# Altium footprint library Connector_Samtec_HLE_SMD.PcbLib: 290 footprints (part 17 of 24) (continued)
## Samtec_HLE-141-02-xxx-DV-A_2x41_P2.54mm_Horizontal [mm] (continued)
F.CrtYd:
  lines w0.05: -52.57,-4.17 52.57,-4.17 52.57,4.17 -52.57,4.17 -52.57,-4.17
F.Fab:
  lines w0.1: -51.3,2.54 -50.8,1.833 -50.3,2.54 ; -52.07,-2.54 52.07,-2.54 52.07,2.54 -52.07,2.54 -52.07,-2.54
  text "'.Designator'" at -4.047,-2.68 h1

## Samtec_HLE-141-02-xxx-DV-BE-A_2x41_P2.54mm_Horizontal [mm]
pads (166):
  rect 1.27x1.68 smd: 1(-50.8,2.72) 2(-50.8,-2.72) 3(-48.26,2.72) 4(-48.26,-2.72) 5(-45.72,2.72) 6(-45.72,-2.72) 7(-43.18,2.72) 8(-43.18,-2.72) 9(-40.64,2.72) 10(-40.64,-2.72) 11(-38.1,2.72) 12(-38.1,-2.72) 13(-35.56,2.72) 14(-35.56,-2.72) 15(-33.02,2.72) 16(-33.02,-2.72) 17(-30.48,2.72) 18(-30.48,-2.72) 19(-27.94,2.72) 20(-27.94,-2.72) 21(-25.4,2.72) 22(-25.4,-2.72) 23(-22.86,2.72) 24(-22.86,-2.72) 25(-20.32,2.72) 26(-20.32,-2.72) 27(-17.78,2.72) 28(-17.78,-2.72) 29(-15.24,2.72) 30(-15.24,-2.72) 31(-12.7,2.72) 32(-12.7,-2.72) 33(-10.16,2.72) 34(-10.16,-2.72) 35(-7.62,2.72) 36(-7.62,-2.72) 37(-5.08,2.72) 38(-5.08,-2.72) 39(-2.54,2.72) 40(-2.54,-2.72) 41(0,2.72) 42(0,-2.72) 43(2.54,2.72) 44(2.54,-2.72) 45(5.08,2.72) 46(5.08,-2.72) 47(7.62,2.72) 48(7.62,-2.72) 49(10.16,2.72) 50(10.16,-2.72) 51(12.7,2.72) 52(12.7,-2.72) 53(15.24,2.72) 54(15.24,-2.72) 55(17.78,2.72) 56(17.78,-2.72) 57(20.32,2.72) 58(20.32,-2.72) 59(22.86,2.72) 60(22.86,-2.72) 61(25.4,2.72) 62(25.4,-2.72) 63(27.94,2.72) 64(27.94,-2.72) 65(30.48,2.72) 66(30.48,-2.72) 67(33.02,2.72) 68(33.02,-2.72) 69(35.56,2.72) 70(35.56,-2.72) 71(38.1,2.72) 72(38.1,-2.72) 73(40.64,2.72) 74(40.64,-2.72) 75(43.18,2.72) 76(43.18,-2.72) 77(45.72,2.72) 78(45.72,-2.72) 79(48.26,2.72) 80(48.26,-2.72) 81(50.8,2.72) 82(50.8,-2.72)
  round 0.97 hole 0.97: Un1(38.1,1.27) Un2(-30.48,1.27) Un3(10.16,-1.27) Un4(-43.18,-1.27) Un5(-17.78,1.27) Un6(20.32,1.27) Un7(45.72,-1.27) Un8(2.54,1.27) Un9(-27.94,1.27) Un10(-40.64,-1.27) Un11(-2.54,1.27) Un12(-38.1,1.27) Un13(17.78,-1.27) Un14(17.78,1.27) Un15(22.86,1.27) Un16(40.64,-1.27) Un17(45.72,1.27) Un18(27.94,-1.27) Un19(0,1.27) Un21(-25.4,1.27) Un22(48.26,1.27) Un23(-12.7,-1.27) Un24(-33.02,-1.27) Un25(35.56,1.27) Un26(15.24,1.27) Un27(2.54,-1.27) Un28(7.62,1.27) Un29(-48.26,-1.27) Un30(-7.62,1.27) Un31(-7.62,-1.27) Un32(-20.32,-1.27) Un33(-43.18,1.27) Un34(-17.78,-1.27) Un35(-38.1,-1.27) Un36(30.48,1.27) Un37(33.02,1.27) Un38(-40.64,1.27) Un39(5.08,1.27) Un40(12.7,-1.27) Un41(35.56,-1.27) Un42(-10.16,1.27) Un43(25.4,1.27) Un44(22.86,-1.27) Un45(27.94,1.27) Un46(-48.26,1.27) Un47(-45.72,1.27) Un48(15.24,-1.27) Un49(-35.56,-1.27) Un50(-33.02,1.27) Un51(-25.4,-1.27) Un52(7.62,-1.27) Un53(0,-1.27) Un54(40.64,1.27) Un55(43.18,1.27) Un56(-50.8,1.27) Un57(-15.24,-1.27) Un58(-35.56,1.27) Un59(38.1,-1.27) Un60(20.32,-1.27) Un61(-20.32,1.27) Un62(-27.94,-1.27) Un63(43.18,-1.27) Un64(-12.7,1.27) Un65(-15.24,1.27) Un66(25.4,-1.27) Un67(5.08,-1.27) Un68(50.8,1.27) Un69(10.16,1.27) Un70(-10.16,-1.27) Un71(12.7,1.27) Un72(48.26,-1.27) Un73(-50.8,-1.27) Un74(50.8,-1.27) Un75(-5.08,-1.27) Un76(30.48,-1.27) Un77(-5.08,1.27) Un78(-45.72,-1.27) Un79(-22.86,1.27) Un80(-2.54,-1.27) Un82(33.02,-1.27) Un83(-22.86,-1.27) Un84(-30.48,-1.27)
  round 1.78 hole 1.78: Un20(49.53,0) Un81(-49.53,0)
F.SilkS:
  lines w0.12: -51.695,-2.65 -52.18,-2.65 -52.18,2.65 -51.695,2.65 -51.695,3.56 ; -49.905,-2.65 -49.155,-2.65 ; -49.905,2.65 -49.155,2.65 ; -47.365,-2.65 -46.615,-2.65 ; -47.365,2.65 -46.615,2.65 ; -44.825,-2.65 -44.075,-2.65 ; -44.825,2.65 -44.075,2.65 ; -42.285,-2.65 -41.535,-2.65 ; -42.285,2.65 -41.535,2.65 ; -39.745,-2.65 -38.995,-2.65 ; -39.745,2.65 -38.995,2.65 ; -37.205,-2.65 -36.455,-2.65 ; -37.205,2.65 -36.455,2.65 ; -34.665,-2.65 -33.915,-2.65 ; -34.665,2.65 -33.915,2.65 ; -32.125,-2.65 -31.375,-2.65 ; -32.125,2.65 -31.375,2.65 ; -29.585,-2.65 -28.835,-2.65 ; -29.585,2.65 -28.835,2.65 ; -27.045,-2.65 -26.295,-2.65 ; -27.045,2.65 -26.295,2.65 ; -24.505,-2.65 -23.755,-2.65 ; -24.505,2.65 -23.755,2.65 ; -21.965,-2.65 -21.215,-2.65 ; -21.965,2.65 -21.215,2.65 ; -19.425,-2.65 -18.675,-2.65 ; -19.425,2.65 -18.675,2.65 ; -16.885,-2.65 -16.135,-2.65 ; -16.885,2.65 -16.135,2.65 ; -14.345,-2.65 -13.595,-2.65 ; -14.345,2.65 -13.595,2.65 ; -11.805,-2.65 -11.055,-2.65 ; -11.805,2.65 -11.055,2.65 ; -9.265,-2.65 -8.515,-2.65 ; -9.265,2.65 -8.515,2.65 ; -6.725,-2.65 -5.975,-2.65 ; -6.725,2.65 -5.975,2.65 ; -4.185,-2.65 -3.435,-2.65 ; -4.185,2.65 -3.435,2.65 ; -1.645,-2.65 -0.895,-2.65 ; -1.645,2.65 -0.895,2.65 ; 0.895,-2.65 1.645,-2.65 ; 0.895,2.65 1.645,2.65 ; 3.435,-2.65 4.185,-2.65 ; 3.435,2.65 4.185,2.65 ; 5.975,-2.65 6.725,-2.65 ; 5.975,2.65 6.725,2.65 ; 8.515,-2.65 9.265,-2.65 ; 8.515,2.65 9.265,2.65 ; 11.055,-2.65 11.805,-2.65 ; 11.055,2.65 11.805,2.65 ; 13.595,-2.65 14.345,-2.65 ; 13.595,2.65 14.345,2.65 ; 16.135,-2.65 16.885,-2.65 ; 16.135,2.65 16.885,2.65 ; 18.675,-2.65 19.425,-2.65 ; 18.675,2.65 19.425,2.65 ; 21.215,-2.65 21.965,-2.65 ; 21.215,2.65 21.965,2.65 ; 23.755,-2.65 24.505,-2.65 ; 23.755,2.65 24.505,2.65 ; 26.295,-2.65 27.045,-2.65 ; 26.295,2.65 27.045,2.65 ; 28.835,-2.65 29.585,-2.65 ; 28.835,2.65 29.585,2.65 ; 31.375,-2.65 32.125,-2.65 ; 31.375,2.65 32.125,2.65 ; 33.915,-2.65 34.665,-2.65 ; 33.915,2.65 34.665,2.65 ; 36.455,-2.65 37.205,-2.65 ; 36.455,2.65 37.205,2.65 ; 38.995,-2.65 39.745,-2.65 ; 38.995,2.65 39.745,2.65 ; 41.535,-2.65 42.285,-2.65 ; 41.535,2.65 42.285,2.65 ; 44.075,-2.65 44.825,-2.65 ; 44.075,2.65 44.825,2.65 ; 46.615,-2.65 47.365,-2.65 ; 46.615,2.65 47.365,2.65 ; 49.155,-2.65 49.905,-2.65 ; 49.155,2.65 49.905,2.65 ; 51.695,-2.65 52.18,-2.65 52.18,2.65 51.695,2.65
F.CrtYd:
  lines w0.05: -52.57,-4.06 -52.57,4.06 52.57,4.06 52.57,-4.06 -52.57,-4.06
F.Fab:
  lines w0.1: -51.3,2.54 -50.8,1.833 -50.3,2.54 ; -52.07,-2.54 52.07,-2.54 52.07,2.54 -52.07,2.54 -52.07,-2.54
  text "'.Designator'" at -4.047,-2.68 h1

## Samtec_HLE-141-02-xxx-DV-BE-LC_2x41_P2.54mm_Horizontal [mm]
pads (166):
  rect 1.27x1.68 smd: 1(-50.8,2.72) 2(-50.8,-2.72) 3(-48.26,2.72) 4(-48.26,-2.72) 5(-45.72,2.72) 6(-45.72,-2.72) 7(-43.18,2.72) 8(-43.18,-2.72) 9(-40.64,2.72) 10(-40.64,-2.72) 11(-38.1,2.72) 12(-38.1,-2.72) 13(-35.56,2.72) 14(-35.56,-2.72) 15(-33.02,2.72) 16(-33.02,-2.72) 17(-30.48,2.72) 18(-30.48,-2.72) 19(-27.94,2.72) 20(-27.94,-2.72) 21(-25.4,2.72) 22(-25.4,-2.72) 23(-22.86,2.72) 24(-22.86,-2.72) 25(-20.32,2.72) 26(-20.32,-2.72) 27(-17.78,2.72) 28(-17.78,-2.72) 29(-15.24,2.72) 30(-15.24,-2.72) 31(-12.7,2.72) 32(-12.7,-2.72) 33(-10.16,2.72) 34(-10.16,-2.72) 35(-7.62,2.72) 36(-7.62,-2.72) 37(-5.08,2.72) 38(-5.08,-2.72) 39(-2.54,2.72) 40(-2.54,-2.72) 41(0,2.72) 42(0,-2.72) 43(2.54,2.72) 44(2.54,-2.72) 45(5.08,2.72) 46(5.08,-2.72) 47(7.62,2.72) 48(7.62,-2.72) 49(10.16,2.72) 50(10.16,-2.72) 51(12.7,2.72) 52(12.7,-2.72) 53(15.24,2.72) 54(15.24,-2.72) 55(17.78,2.72) 56(17.78,-2.72) 57(20.32,2.72) 58(20.32,-2.72) 59(22.86,2.72) 60(22.86,-2.72) 61(25.4,2.72) 62(25.4,-2.72) 63(27.94,2.72) 64(27.94,-2.72) 65(30.48,2.72) 66(30.48,-2.72) 67(33.02,2.72) 68(33.02,-2.72) 69(35.56,2.72) 70(35.56,-2.72) 71(38.1,2.72) 72(38.1,-2.72) 73(40.64,2.72) 74(40.64,-2.72) 75(43.18,2.72) 76(43.18,-2.72) 77(45.72,2.72) 78(45.72,-2.72) 79(48.26,2.72) 80(48.26,-2.72) 81(50.8,2.72) 82(50.8,-2.72)
  round 0.97 hole 0.97: Un1(20.32,1.27) Un2(-43.18,-1.27) Un3(45.72,1.27) Un4(33.02,1.27) Un5(-20.32,-1.27) Un6(45.72,-1.27) Un7(-38.1,-1.27) Un8(33.02,-1.27) Un9(25.4,-1.27) Un10(20.32,-1.27) Un11(-17.78,-1.27) Un12(-48.26,-1.27) Un13(-2.54,1.27) Un14(27.94,-1.27) Un15(-27.94,1.27) Un16(5.08,1.27) Un17(-27.94,-1.27) Un18(-12.7,1.27) Un19(38.1,-1.27) Un20(-10.16,-1.27) Un21(30.48,-1.27) Un22(-22.86,1.27) Un23(38.1,1.27) Un24(-15.24,-1.27) Un25(0,1.27) Un26(-7.62,1.27) Un27(-38.1,1.27) Un28(-30.48,1.27) Un29(-35.56,-1.27) Un30(25.4,1.27) Un31(-10.16,1.27) Un32(-20.32,1.27) Un33(-33.02,-1.27) Un34(-5.08,-1.27) Un35(-5.08,1.27) Un36(12.7,1.27) Un37(-35.56,1.27) Un38(-17.78,1.27) Un39(35.56,1.27) Un40(22.86,-1.27) Un41(7.62,-1.27) Un42(50.8,1.27) Un43(-30.48,-1.27) Un44(-48.26,1.27) Un45(-50.8,-1.27) Un46(-22.86,-1.27) Un47(-50.8,1.27) Un48(-2.54,-1.27) Un49(-15.24,1.27) Un50(-25.4,-1.27) Un51(40.64,-1.27) Un52(48.26,1.27) Un53(-12.7,-1.27) Un54(12.7,-1.27) Un55(10.16,1.27) Un56(7.62,1.27) Un57(-40.64,-1.27) Un59(10.16,-1.27) Un60(0,-1.27) Un61(17.78,-1.27) Un62(2.54,1.27) Un63(15.24,-1.27) Un64(-7.62,-1.27) Un65(-33.02,1.27) Un66(48.26,-1.27) Un67(-43.18,1.27) Un68(30.48,1.27) Un69(27.94,1.27) Un70(5.08,-1.27) Un71(17.78,1.27) Un72(-40.64,1.27) Un73(50.8,-1.27) Un74(15.24,1.27) Un76(40.64,1.27) Un77(22.86,1.27) Un78(2.54,-1.27) Un79(-45.72,1.27) Un80(43.18,1.27) Un81(35.56,-1.27) Un82(-25.4,1.27) Un83(43.18,-1.27) Un84(-45.72,-1.27)
  round 1.19 hole 1.19: Un58(49.53,0) Un75(-49.53,0)
F.SilkS:
  lines w0.12: -51.695,-2.65 -52.18,-2.65 -52.18,2.65 -51.695,2.65 -51.695,3.56 ; -49.905,-2.65 -49.155,-2.65 ; -49.905,2.65 -49.155,2.65 ; -47.365,-2.65 -46.615,-2.65 ; -47.365,2.65 -46.615,2.65 ; -44.825,-2.65 -44.075,-2.65 ; -44.825,2.65 -44.075,2.65 ; -42.285,-2.65 -41.535,-2.65 ; -42.285,2.65 -41.535,2.65 ; -39.745,-2.65 -38.995,-2.65 ; -39.745,2.65 -38.995,2.65 ; -37.205,-2.65 -36.455,-2.65 ; -37.205,2.65 -36.455,2.65 ; -34.665,-2.65 -33.915,-2.65 ; -34.665,2.65 -33.915,2.65 ; -32.125,-2.65 -31.375,-2.65 ; -32.125,2.65 -31.375,2.65 ; -29.585,-2.65 -28.835,-2.65 ; -29.585,2.65 -28.835,2.65 ; -27.045,-2.65 -26.295,-2.65 ; -27.045,2.65 -26.295,2.65 ; -24.505,-2.65 -23.755,-2.65 ; -24.505,2.65 -23.755,2.65 ; -21.965,-2.65 -21.215,-2.65 ; -21.965,2.65 -21.215,2.65 ; -19.425,-2.65 -18.675,-2.65 ; -19.425,2.65 -18.675,2.65 ; -16.885,-2.65 -16.135,-2.65 ; -16.885,2.65 -16.135,2.65 ; -14.345,-2.65 -13.595,-2.65 ; -14.345,2.65 -13.595,2.65 ; -11.805,-2.65 -11.055,-2.65 ; -11.805,2.65 -11.055,2.65 ; -9.265,-2.65 -8.515,-2.65 ; -9.265,2.65 -8.515,2.65 ; -6.725,-2.65 -5.975,-2.65 ; -6.725,2.65 -5.975,2.65 ; -4.185,-2.65 -3.435,-2.65 ; -4.185,2.65 -3.435,2.65 ; -1.645,-2.65 -0.895,-2.65 ; -1.645,2.65 -0.895,2.65 ; 0.895,-2.65 1.645,-2.65 ; 0.895,2.65 1.645,2.65 ; 3.435,-2.65 4.185,-2.65 ; 3.435,2.65 4.185,2.65 ; 5.975,-2.65 6.725,-2.65 ; 5.975,2.65 6.725,2.65 ; 8.515,-2.65 9.265,-2.65 ; 8.515,2.65 9.265,2.65 ; 11.055,-2.65 11.805,-2.65 ; 11.055,2.65 11.805,2.65 ; 13.595,-2.65 14.345,-2.65 ; 13.595,2.65 14.345,2.65 ; 16.135,-2.65 16.885,-2.65 ; 16.135,2.65 16.885,2.65 ; 18.675,-2.65 19.425,-2.65 ; 18.675,2.65 19.425,2.65 ; 21.215,-2.65 21.965,-2.65 ; 21.215,2.65 21.965,2.65 ; 23.755,-2.65 24.505,-2.65 ; 23.755,2.65 24.505,2.65 ; 26.295,-2.65 27.045,-2.65 ; 26.295,2.65 27.045,2.65 ; 28.835,-2.65 29.585,-2.65 ; 28.835,2.65 29.585,2.65 ; 31.375,-2.65 32.125,-2.65 ; 31.375,2.65 32.125,2.65 ; 33.915,-2.65 34.665,-2.65 ; 33.915,2.65 34.665,2.65 ; 36.455,-2.65 37.205,-2.65 ; 36.455,2.65 37.205,2.65 ; 38.995,-2.65 39.745,-2.65 ; 38.995,2.65 39.745,2.65 ; 41.535,-2.65 42.285,-2.65 ; 41.535,2.65 42.285,2.65 ; 44.075,-2.65 44.825,-2.65 ; 44.075,2.65 44.825,2.65 ; 46.615,-2.65 47.365,-2.65 ; 46.615,2.65 47.365,2.65 ; 49.155,-2.65 49.905,-2.65 ; 49.155,2.65 49.905,2.65 ; 51.695,-2.65 52.18,-2.65 52.18,2.65 51.695,2.65
F.CrtYd:
  lines w0.05: -52.57,-4.06 -52.57,4.06 52.57,4.06 52.57,-4.06 -52.57,-4.06
F.Fab:
  lines w0.1: -51.3,2.54 -50.8,1.833 -50.3,2.54 ; -52.07,-2.54 52.07,-2.54 52.07,2.54 -52.07,2.54 -52.07,-2.54
  text "'.Designator'" at -4.047,-2.68 h1

## Samtec_HLE-141-02-xxx-DV-BE_2x41_P2.54mm_Horizontal [mm]
pads (164):
  rect 1.27x1.68 smd: 1(-50.8,2.72) 2(-50.8,-2.72) 3(-48.26,2.72) 4(-48.26,-2.72) 5(-45.72,2.72) 6(-45.72,-2.72) 7(-43.18,2.72) 8(-43.18,-2.72) 9(-40.64,2.72) 10(-40.64,-2.72) 11(-38.1,2.72) 12(-38.1,-2.72) 13(-35.56,2.72) 14(-35.56,-2.72) 15(-33.02,2.72) 16(-33.02,-2.72) 17(-30.48,2.72) 18(-30.48,-2.72) 19(-27.94,2.72) 20(-27.94,-2.72) 21(-25.4,2.72) 22(-25.4,-2.72) 23(-22.86,2.72) 24(-22.86,-2.72) 25(-20.32,2.72) 26(-20.32,-2.72) 27(-17.78,2.72) 28(-17.78,-2.72) 29(-15.24,2.72) 30(-15.24,-2.72) 31(-12.7,2.72) 32(-12.7,-2.72) 33(-10.16,2.72) 34(-10.16,-2.72) 35(-7.62,2.72) 36(-7.62,-2.72) 37(-5.08,2.72) 38(-5.08,-2.72) 39(-2.54,2.72) 40(-2.54,-2.72) 41(0,2.72) 42(0,-2.72) 43(2.54,2.72) 44(2.54,-2.72) 45(5.08,2.72) 46(5.08,-2.72) 47(7.62,2.72) 48(7.62,-2.72) 49(10.16,2.72) 50(10.16,-2.72) 51(12.7,2.72) 52(12.7,-2.72) 53(15.24,2.72) 54(15.24,-2.72) 55(17.78,2.72) 56(17.78,-2.72) 57(20.32,2.72) 58(20.32,-2.72) 59(22.86,2.72) 60(22.86,-2.72) 61(25.4,2.72) 62(25.4,-2.72) 63(27.94,2.72) 64(27.94,-2.72) 65(30.48,2.72) 66(30.48,-2.72) 67(33.02,2.72) 68(33.02,-2.72) 69(35.56,2.72) 70(35.56,-2.72) 71(38.1,2.72) 72(38.1,-2.72) 73(40.64,2.72) 74(40.64,-2.72) 75(43.18,2.72) 76(43.18,-2.72) 77(45.72,2.72) 78(45.72,-2.72) 79(48.26,2.72) 80(48.26,-2.72) 81(50.8,2.72) 82(50.8,-2.72)
  round 0.97 hole 0.97: Un1(22.86,1.27) Un2(-27.94,1.27) Un3(-22.86,-1.27) Un4(-33.02,1.27) Un5(30.48,-1.27) Un6(17.78,-1.27) Un7(15.24,1.27) Un8(33.02,-1.27) Un9(38.1,1.27) Un10(-45.72,1.27) Un11(50.8,-1.27) Un12(30.48,1.27) Un13(-10.16,1.27) Un14(-2.54,-1.27) Un15(5.08,1.27) Un16(-35.56,-1.27) Un17(25.4,-1.27) Un18(35.56,-1.27) Un19(-20.32,-1.27) Un20(-12.7,1.27) Un21(-7.62,-1.27) Un22(7.62,1.27) Un23(-7.62,1.27) Un24(-12.7,-1.27) Un25(-25.4,1.27) Un26(48.26,1.27) Un27(5.08,-1.27) Un28(15.24,-1.27) Un29(50.8,1.27) Un30(-17.78,1.27) Un31(-33.02,-1.27) Un32(-38.1,1.27) Un33(17.78,1.27) Un34(-27.94,-1.27) Un35(12.7,-1.27) Un36(-40.64,1.27) Un37(22.86,-1.27) Un38(-43.18,-1.27) Un39(45.72,1.27) Un40(-20.32,1.27) Un41(-15.24,-1.27) Un42(-50.8,-1.27) Un43(-30.48,1.27) Un44(-30.48,-1.27) Un45(45.72,-1.27) Un46(43.18,1.27) Un47(2.54,1.27) Un48(40.64,1.27) Un49(2.54,-1.27) Un50(27.94,1.27) Un51(-43.18,1.27) Un52(33.02,1.27) Un53(-15.24,1.27) Un54(20.32,1.27) Un55(12.7,1.27) Un56(-22.86,1.27) Un57(48.26,-1.27) Un58(-48.26,1.27) Un59(-25.4,-1.27) Un60(7.62,-1.27) Un61(-10.16,-1.27) Un62(-38.1,-1.27) Un63(43.18,-1.27) Un64(0,-1.27) Un65(-2.54,1.27) Un66(25.4,1.27) Un67(27.94,-1.27) Un68(-48.26,-1.27) Un69(-50.8,1.27) Un70(35.56,1.27) Un71(-40.64,-1.27) Un72(10.16,1.27) Un73(40.64,-1.27) Un74(-35.56,1.27) Un75(-17.78,-1.27) Un76(38.1,-1.27) Un77(-5.08,-1.27) Un78(-45.72,-1.27) Un79(0,1.27) Un80(20.32,-1.27) Un81(-5.08,1.27) Un82(10.16,-1.27)
F.SilkS:
  lines w0.12: -51.695,-2.65 -52.18,-2.65 -52.18,2.65 -51.695,2.65 -51.695,3.56 ; -49.905,-2.65 -49.155,-2.65 ; -49.905,2.65 -49.155,2.65 ; -47.365,-2.65 -46.615,-2.65 ; -47.365,2.65 -46.615,2.65 ; -44.825,-2.65 -44.075,-2.65 ; -44.825,2.65 -44.075,2.65 ; -42.285,-2.65 -41.535,-2.65 ; -42.285,2.65 -41.535,2.65 ; -39.745,-2.65 -38.995,-2.65 ; -39.745,2.65 -38.995,2.65 ; -37.205,-2.65 -36.455,-2.65 ; -37.205,2.65 -36.455,2.65 ; -34.665,-2.65 -33.915,-2.65 ; -34.665,2.65 -33.915,2.65 ; -32.125,-2.65 -31.375,-2.65 ; -32.125,2.65 -31.375,2.65 ; -29.585,-2.65 -28.835,-2.65 ; -29.585,2.65 -28.835,2.65 ; -27.045,-2.65 -26.295,-2.65 ; -27.045,2.65 -26.295,2.65 ; -24.505,-2.65 -23.755,-2.65 ; -24.505,2.65 -23.755,2.65 ; -21.965,-2.65 -21.215,-2.65 ; -21.965,2.65 -21.215,2.65 ; -19.425,-2.65 -18.675,-2.65 ; -19.425,2.65 -18.675,2.65 ; -16.885,-2.65 -16.135,-2.65 ; -16.885,2.65 -16.135,2.65 ; -14.345,-2.65 -13.595,-2.65 ; -14.345,2.65 -13.595,2.65 ; -11.805,-2.65 -11.055,-2.65 ; -11.805,2.65 -11.055,2.65 ; -9.265,-2.65 -8.515,-2.65 ; -9.265,2.65 -8.515,2.65 ; -6.725,-2.65 -5.975,-2.65 ; -6.725,2.65 -5.975,2.65 ; -4.185,-2.65 -3.435,-2.65 ; -4.185,2.65 -3.435,2.65 ; -1.645,-2.65 -0.895,-2.65 ; -1.645,2.65 -0.895,2.65 ; 0.895,-2.65 1.645,-2.65 ; 0.895,2.65 1.645,2.65 ; 3.435,-2.65 4.185,-2.65 ; 3.435,2.65 4.185,2.65 ; 5.975,-2.65 6.725,-2.65 ; 5.975,2.65 6.725,2.65 ; 8.515,-2.65 9.265,-2.65 ; 8.515,2.65 9.265,2.65 ; 11.055,-2.65 11.805,-2.65 ; 11.055,2.65 11.805,2.65 ; 13.595,-2.65 14.345,-2.65 ; 13.595,2.65 14.345,2.65 ; 16.135,-2.65 16.885,-2.65 ; 16.135,2.65 16.885,2.65 ; 18.675,-2.65 19.425,-2.65 ; 18.675,2.65 19.425,2.65 ; 21.215,-2.65 21.965,-2.65 ; 21.215,2.65 21.965,2.65 ; 23.755,-2.65 24.505,-2.65 ; 23.755,2.65 24.505,2.65 ; 26.295,-2.65 27.045,-2.65 ; 26.295,2.65 27.045,2.65 ; 28.835,-2.65 29.585,-2.65 ; 28.835,2.65 29.585,2.65 ; 31.375,-2.65 32.125,-2.65 ; 31.375,2.65 32.125,2.65 ; 33.915,-2.65 34.665,-2.65 ; 33.915,2.65 34.665,2.65 ; 36.455,-2.65 37.205,-2.65 ; 36.455,2.65 37.205,2.65 ; 38.995,-2.65 39.745,-2.65 ; 38.995,2.65 39.745,2.65 ; 41.535,-2.65 42.285,-2.65 ; 41.535,2.65 42.285,2.65 ; 44.075,-2.65 44.825,-2.65 ; 44.075,2.65 44.825,2.65 ; 46.615,-2.65 47.365,-2.65 ; 46.615,2.65 47.365,2.65 ; 49.155,-2.65 49.905,-2.65 ; 49.155,2.65 49.905,2.65 ; 51.695,-2.65 52.18,-2.65 52.18,2.65 51.695,2.65
F.CrtYd:
  lines w0.05: -52.57,-4.06 52.57,-4.06 52.57,4.06 -52.57,4.06 -52.57,-4.06
F.Fab:
  lines w0.1: -51.3,2.54 -50.8,1.833 -50.3,2.54 ; -52.07,-2.54 52.07,-2.54 52.07,2.54 -52.07,2.54 -52.07,-2.54
  text "'.Designator'" at -4.047,-2.68 h1

## Samtec_HLE-141-02-xxx-DV-LC_2x41_P2.54mm_Horizontal [mm]
pads (84):
  rect 1.27x2.29 smd: 1(-50.8,2.525) 2(-50.8,-2.525) 3(-48.26,2.525) 4(-48.26,-2.525) 5(-45.72,2.525) 6(-45.72,-2.525) 7(-43.18,2.525) 8(-43.18,-2.525) 9(-40.64,2.525) 10(-40.64,-2.525) 11(-38.1,2.525) 12(-38.1,-2.525) 13(-35.56,2.525) 14(-35.56,-2.525) 15(-33.02,2.525) 16(-33.02,-2.525) 17(-30.48,2.525) 18(-30.48,-2.525) 19(-27.94,2.525) 20(-27.94,-2.525) 21(-25.4,2.525) 22(-25.4,-2.525) 23(-22.86,2.525) 24(-22.86,-2.525) 25(-20.32,2.525) 26(-20.32,-2.525) 27(-17.78,2.525) 28(-17.78,-2.525) 29(-15.24,2.525) 30(-15.24,-2.525) 31(-12.7,2.525) 32(-12.7,-2.525) 33(-10.16,2.525) 34(-10.16,-2.525) 35(-7.62,2.525) 36(-7.62,-2.525) 37(-5.08,2.525) 38(-5.08,-2.525) 39(-2.54,2.525) 40(-2.54,-2.525) 41(0,2.525) 42(0,-2.525) 43(2.54,2.525) 44(2.54,-2.525) 45(5.08,2.525) 46(5.08,-2.525) 47(7.62,2.525) 48(7.62,-2.525) 49(10.16,2.525) 50(10.16,-2.525) 51(12.7,2.525) 52(12.7,-2.525) 53(15.24,2.525) 54(15.24,-2.525) 55(17.78,2.525) 56(17.78,-2.525) 57(20.32,2.525) 58(20.32,-2.525) 59(22.86,2.525) 60(22.86,-2.525) 61(25.4,2.525) 62(25.4,-2.525) 63(27.94,2.525) 64(27.94,-2.525) 65(30.48,2.525) 66(30.48,-2.525) 67(33.02,2.525) 68(33.02,-2.525) 69(35.56,2.525) 70(35.56,-2.525) 71(38.1,2.525) 72(38.1,-2.525) 73(40.64,2.525) 74(40.64,-2.525) 75(43.18,2.525) 76(43.18,-2.525) 77(45.72,2.525) 78(45.72,-2.525) 79(48.26,2.525) 80(48.26,-2.525) 81(50.8,2.525) 82(50.8,-2.525)
  round 1.19 hole 1.19: Un1(-49.53,0) Un2(49.53,0)
F.SilkS:
  lines w0.12: -51.695,-2.65 -52.18,-2.65 -52.18,2.65 -51.695,2.65 -51.695,3.67 ; -49.905,-2.65 -49.155,-2.65 ; -49.905,2.65 -49.155,2.65 ; -47.365,-2.65 -46.615,-2.65 ; -47.365,2.65 -46.615,2.65 ; -44.825,-2.65 -44.075,-2.65 ; -44.825,2.65 -44.075,2.65 ; -42.285,-2.65 -41.535,-2.65 ; -42.285,2.65 -41.535,2.65 ; -39.745,-2.65 -38.995,-2.65 ; -39.745,2.65 -38.995,2.65 ; -37.205,-2.65 -36.455,-2.65 ; -37.205,2.65 -36.455,2.65 ; -34.665,-2.65 -33.915,-2.65 ; -34.665,2.65 -33.915,2.65 ; -32.125,-2.65 -31.375,-2.65 ; -32.125,2.65 -31.375,2.65 ; -29.585,-2.65 -28.835,-2.65 ; -29.585,2.65 -28.835,2.65 ; -27.045,-2.65 -26.295,-2.65 ; -27.045,2.65 -26.295,2.65 ; -24.505,-2.65 -23.755,-2.65 ; -24.505,2.65 -23.755,2.65 ; -21.965,-2.65 -21.215,-2.65 ; -21.965,2.65 -21.215,2.65 ; -19.425,-2.65 -18.675,-2.65 ; -19.425,2.65 -18.675,2.65 ; -16.885,-2.65 -16.135,-2.65 ; -16.885,2.65 -16.135,2.65 ; -14.345,-2.65 -13.595,-2.65 ; -14.345,2.65 -13.595,2.65 ; -11.805,-2.65 -11.055,-2.65 ; -11.805,2.65 -11.055,2.65 ; -9.265,-2.65 -8.515,-2.65 ; -9.265,2.65 -8.515,2.65 ; -6.725,-2.65 -5.975,-2.65 ; -6.725,2.65 -5.975,2.65 ; -4.185,-2.65 -3.435,-2.65 ; -4.185,2.65 -3.435,2.65 ; -1.645,-2.65 -0.895,-2.65 ; -1.645,2.65 -0.895,2.65 ; 0.895,-2.65 1.645,-2.65 ; 0.895,2.65 1.645,2.65 ; 3.435,-2.65 4.185,-2.65 ; 3.435,2.65 4.185,2.65 ; 5.975,-2.65 6.725,-2.65 ; 5.975,2.65 6.725,2.65 ; 8.515,-2.65 9.265,-2.65 ; 8.515,2.65 9.265,2.65 ; 11.055,-2.65 11.805,-2.65 ; 11.055,2.65 11.805,2.65 ; 13.595,-2.65 14.345,-2.65 ; 13.595,2.65 14.345,2.65 ; 16.135,-2.65 16.885,-2.65 ; 16.135,2.65 16.885,2.65 ; 18.675,-2.65 19.425,-2.65 ; 18.675,2.65 19.425,2.65 ; 21.215,-2.65 21.965,-2.65 ; 21.215,2.65 21.965,2.65 ; 23.755,-2.65 24.505,-2.65 ; 23.755,2.65 24.505,2.65 ; 26.295,-2.65 27.045,-2.65 ; 26.295,2.65 27.045,2.65 ; 28.835,-2.65 29.585,-2.65 ; 28.835,2.65 29.585,2.65 ; 31.375,-2.65 32.125,-2.65 ; 31.375,2.65 32.125,2.65 ; 33.915,-2.65 34.665,-2.65 ; 33.915,2.65 34.665,2.65 ; 36.455,-2.65 37.205,-2.65 ; 36.455,2.65 37.205,2.65 ; 38.995,-2.65 39.745,-2.65 ; 38.995,2.65 39.745,2.65 ; 41.535,-2.65 42.285,-2.65 ; 41.535,2.65 42.285,2.65 ; 44.075,-2.65 44.825,-2.65 ; 44.075,2.65 44.825,2.65 ; 46.615,-2.65 47.365,-2.65 ; 46.615,2.65 47.365,2.65 ; 49.155,-2.65 49.905,-2.65 ; 49.155,2.65 49.905,2.65 ; 51.695,-2.65 52.18,-2.65 52.18,2.65 51.695,2.65
F.CrtYd:
  lines w0.05: -52.57,-4.17 52.57,-4.17 52.57,4.17 -52.57,4.17 -52.57,-4.17
F.Fab:
  lines w0.1: -51.3,2.54 -50.8,1.833 -50.3,2.54 ; -52.07,-2.54 -52.07,2.54 52.07,2.54 52.07,-2.54 -52.07,-2.54
  text "'.Designator'" at -4.047,-2.68 h1

## Samtec_HLE-141-02-xxx-DV_2x41_P2.54mm_Horizontal [mm]
pads (82):
  rect 1.27x2.29 smd: 1(-50.8,2.525) 2(-50.8,-2.525) 3(-48.26,2.525) 4(-48.26,-2.525) 5(-45.72,2.525) 6(-45.72,-2.525) 7(-43.18,2.525) 8(-43.18,-2.525) 9(-40.64,2.525) 10(-40.64,-2.525) 11(-38.1,2.525) 12(-38.1,-2.525) 13(-35.56,2.525) 14(-35.56,-2.525) 15(-33.02,2.525) 16(-33.02,-2.525) 17(-30.48,2.525) 18(-30.48,-2.525) 19(-27.94,2.525) 20(-27.94,-2.525) 21(-25.4,2.525) 22(-25.4,-2.525) 23(-22.86,2.525) 24(-22.86,-2.525) 25(-20.32,2.525) 26(-20.32,-2.525) 27(-17.78,2.525) 28(-17.78,-2.525) 29(-15.24,2.525) 30(-15.24,-2.525) 31(-12.7,2.525) 32(-12.7,-2.525) 33(-10.16,2.525) 34(-10.16,-2.525) 35(-7.62,2.525) 36(-7.62,-2.525) 37(-5.08,2.525) 38(-5.08,-2.525) 39(-2.54,2.525) 40(-2.54,-2.525) 41(0,2.525) 42(0,-2.525) 43(2.54,2.525) 44(2.54,-2.525) 45(5.08,2.525) 46(5.08,-2.525) 47(7.62,2.525) 48(7.62,-2.525) 49(10.16,2.525) 50(10.16,-2.525) 51(12.7,2.525) 52(12.7,-2.525) 53(15.24,2.525) 54(15.24,-2.525) 55(17.78,2.525) 56(17.78,-2.525) 57(20.32,2.525) 58(20.32,-2.525) 59(22.86,2.525) 60(22.86,-2.525) 61(25.4,2.525) 62(25.4,-2.525) 63(27.94,2.525) 64(27.94,-2.525) 65(30.48,2.525) 66(30.48,-2.525) 67(33.02,2.525) 68(33.02,-2.525) 69(35.56,2.525) 70(35.56,-2.525) 71(38.1,2.525) 72(38.1,-2.525) 73(40.64,2.525) 74(40.64,-2.525) 75(43.18,2.525) 76(43.18,-2.525) 77(45.72,2.525) 78(45.72,-2.525) 79(48.26,2.525) 80(48.26,-2.525) 81(50.8,2.525) 82(50.8,-2.525)
F.SilkS:
  lines w0.12: -51.695,-2.65 -52.18,-2.65 -52.18,2.65 -51.695,2.65 -51.695,3.67 ; -49.905,-2.65 -49.155,-2.65 ; -49.905,2.65 -49.155,2.65 ; -47.365,-2.65 -46.615,-2.65 ; -47.365,2.65 -46.615,2.65 ; -44.825,-2.65 -44.075,-2.65 ; -44.825,2.65 -44.075,2.65 ; -42.285,-2.65 -41.535,-2.65 ; -42.285,2.65 -41.535,2.65 ; -39.745,-2.65 -38.995,-2.65 ; -39.745,2.65 -38.995,2.65 ; -37.205,-2.65 -36.455,-2.65 ; -37.205,2.65 -36.455,2.65 ; -34.665,-2.65 -33.915,-2.65 ; -34.665,2.65 -33.915,2.65 ; -32.125,-2.65 -31.375,-2.65 ; -32.125,2.65 -31.375,2.65 ; -29.585,-2.65 -28.835,-2.65 ; -29.585,2.65 -28.835,2.65 ; -27.045,-2.65 -26.295,-2.65 ; -27.045,2.65 -26.295,2.65 ; -24.505,-2.65 -23.755,-2.65 ; -24.505,2.65 -23.755,2.65 ; -21.965,-2.65 -21.215,-2.65 ; -21.965,2.65 -21.215,2.65 ; -19.425,-2.65 -18.675,-2.65 ; -19.425,2.65 -18.675,2.65 ; -16.885,-2.65 -16.135,-2.65 ; -16.885,2.65 -16.135,2.65 ; -14.345,-2.65 -13.595,-2.65 ; -14.345,2.65 -13.595,2.65 ; -11.805,-2.65 -11.055,-2.65 ; -11.805,2.65 -11.055,2.65 ; -9.265,-2.65 -8.515,-2.65 ; -9.265,2.65 -8.515,2.65 ; -6.725,-2.65 -5.975,-2.65 ; -6.725,2.65 -5.975,2.65 ; -4.185,-2.65 -3.435,-2.65 ; -4.185,2.65 -3.435,2.65 ; -1.645,-2.65 -0.895,-2.65 ; -1.645,2.65 -0.895,2.65 ; 0.895,-2.65 1.645,-2.65 ; 0.895,2.65 1.645,2.65 ; 3.435,-2.65 4.185,-2.65 ; 3.435,2.65 4.185,2.65 ; 5.975,-2.65 6.725,-2.65 ; 5.975,2.65 6.725,2.65 ; 8.515,-2.65 9.265,-2.65 ; 8.515,2.65 9.265,2.65 ; 11.055,-2.65 11.805,-2.65 ; 11.055,2.65 11.805,2.65 ; 13.595,-2.65 14.345,-2.65 ; 13.595,2.65 14.345,2.65 ; 16.135,-2.65 16.885,-2.65 ; 16.135,2.65 16.885,2.65 ; 18.675,-2.65 19.425,-2.65 ; 18.675,2.65 19.425,2.65 ; 21.215,-2.65 21.965,-2.65 ; 21.215,2.65 21.965,2.65 ; 23.755,-2.65 24.505,-2.65 ; 23.755,2.65 24.505,2.65 ; 26.295,-2.65 27.045,-2.65 ; 26.295,2.65 27.045,2.65 ; 28.835,-2.65 29.585,-2.65 ; 28.835,2.65 29.585,2.65 ; 31.375,-2.65 32.125,-2.65 ; 31.375,2.65 32.125,2.65 ; 33.915,-2.65 34.665,-2.65 ; 33.915,2.65 34.665,2.65 ; 36.455,-2.65 37.205,-2.65 ; 36.455,2.65 37.205,2.65 ; 38.995,-2.65 39.745,-2.65 ; 38.995,2.65 39.745,2.65 ; 41.535,-2.65 42.285,-2.65 ; 41.535,2.65 42.285,2.65 ; 44.075,-2.65 44.825,-2.65 ; 44.075,2.65 44.825,2.65 ; 46.615,-2.65 47.365,-2.65 ; 46.615,2.65 47.365,2.65 ; 49.155,-2.65 49.905,-2.65 ; 49.155,2.65 49.905,2.65 ; 51.695,-2.65 52.18,-2.65 52.18,2.65 51.695,2.65
F.CrtYd:
  lines w0.05: -52.57,-4.17 52.57,-4.17 52.57,4.17 -52.57,4.17 -52.57,-4.17
F.Fab:
  lines w0.1: -51.3,2.54 -50.8,1.833 -50.3,2.54 ; -52.07,-2.54 -52.07,2.54 52.07,2.54 52.07,-2.54 -52.07,-2.54
  text "'.Designator'" at -4.047,-2.68 h1